# Altium footprint library bitfury.PcbLib: 41 footprints (part 2 of 3)
Each footprint in its own frame and in the unit in brackets; x right, y up, seen from the top. Pads: shape width x height; smd on the part's side, far side on the other; paste and mask are expansions set on the pad; w line width, h text height; cw(c..) or ccw(c..) is an arc to the next point about the centre after c.
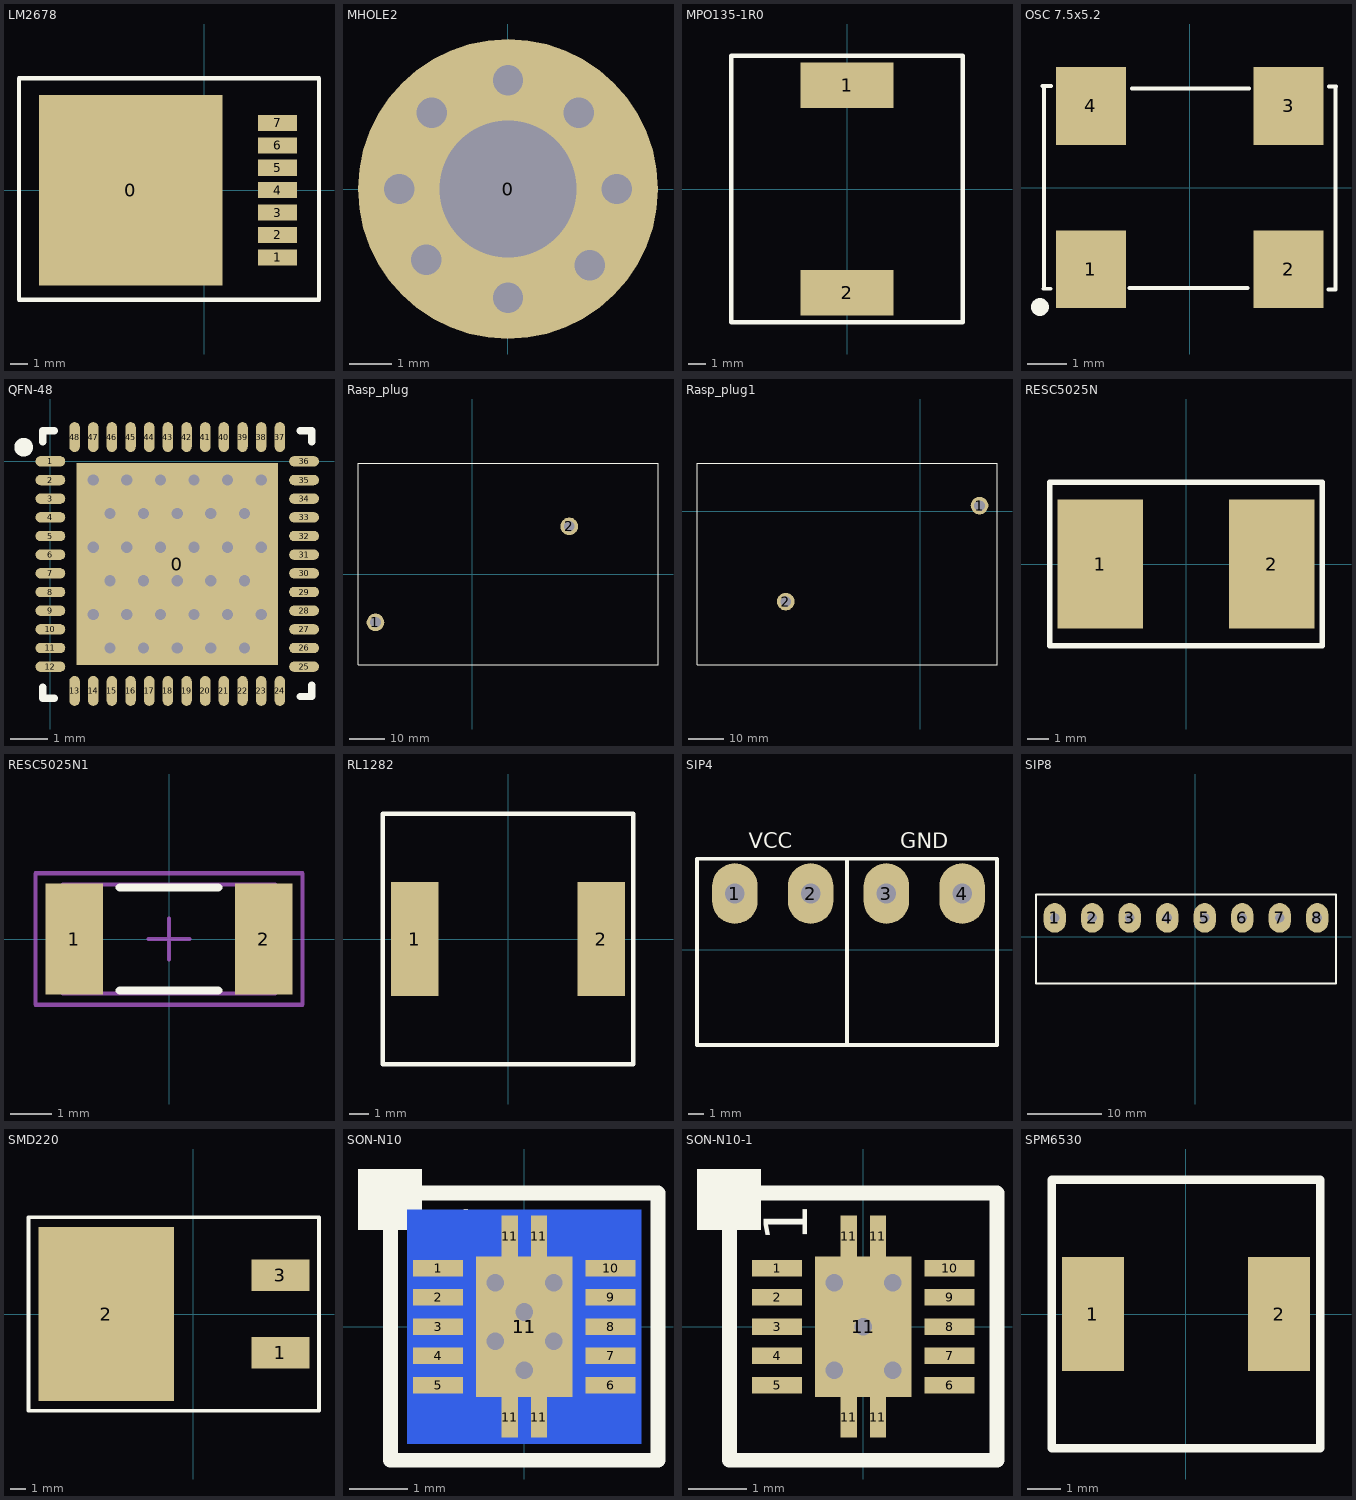
[diagram p1: the footprints below, top view; thin cyan lines are the x and y axes]

## LM2678 [mm]
pads (8):
  rect 10.41x10.8 smd: 0(-4.16,0)
  rect 2.2x0.91 smd: 1(4.16,-3.81) 2(4.16,-2.54) 3(4.16,-1.27) 4(4.16,0) 5(4.16,1.27) 6(4.16,2.54) 7(4.16,3.81)
Top Overlay:
  lines w0.254: -10.51,-6.223 6.508,-6.223 6.508,6.35 -9.875,6.35 -10.51,6.35 -10.51,-6.223

## MHOLE2 [mm]
pads (1):
  round 7 hole 3.2 unplated: 0(0,0)
via 0,2.54 diameter 1.27 hole 0.711
via 2.54,0 diameter 1.27 hole 0.711
via -2.54,0 diameter 1.27 hole 0.711
via 0,-2.54 diameter 1.27 hole 0.711
via -1.905,-1.651 diameter 1.27 hole 0.711
via -1.778,1.778 diameter 1.27 hole 0.711
via 1.651,1.778 diameter 1.27 hole 0.711
via 1.905,-1.778 diameter 1.27 hole 0.711

## MPO135-1R0 [mm]
pads (2):
  rect 5.2x2.54 smd: 1(0,5.83) 2(0,-5.83)
Top Overlay:
  lines w0.254: -6.5,-7.5 6.5,-7.5 6.5,7.5 -6.5,7.5 -6.5,-7.5

## OSC 7.5x5.2 [mm]
pads (4):
  rect 1.8x2 smd: 1(-2.54,-2.1) 2(2.54,-2.1) 3(2.54,2.1) 4(-2.54,2.1)
Top Overlay:
  circle w0.254: c-3.85,-3.07 r0.102
  lines w0.1: -3.78,2.61 -3.56,2.61 ; -3.76,-2.6 -3.58,-2.6 ; -3.75,-2.6 -3.75,2.6 ; -1.55,-2.58 1.49,-2.58 ; -1.48,2.55 1.53,2.55 ; 3.57,-2.62 3.75,-2.62 ; 3.58,2.6 3.76,2.6 ; 3.75,-2.6 3.75,2.6

## QFN-48 [mm]
pads (49):
  rect 5.4x5.4 smd paste-0.7 mask-0.4: 0(3.399,-2.75)
  oval 0.8x0.28 smd paste+0.051 mask+0.075: 1(0,0) 2(0,-0.5) 3(0,-1) 4(0,-1.5) 5(0,-2) 6(0,-2.5) 7(0,-3) 8(0,-3.5) 9(0,-4) 10(0,-4.5) 11(0,-5) 12(0,-5.5) 25(6.798,-5.5) 26(6.798,-5) 27(6.798,-4.5) 28(6.798,-4) 29(6.798,-3.5) 30(6.798,-3) 31(6.798,-2.5) 32(6.798,-2) 33(6.798,-1.5) 34(6.798,-1) 35(6.798,-0.5) 36(6.798,0)
  oval 0.28x0.8 smd paste+0.051 mask+0.075: 13(0.649,-6.149) 14(1.149,-6.149) 15(1.649,-6.149) 16(2.149,-6.149) 17(2.649,-6.149) 18(3.149,-6.149) 19(3.649,-6.149) 20(4.149,-6.149) 21(4.649,-6.149) 22(5.149,-6.149) 23(5.649,-6.149) 24(6.149,-6.149) 37(6.149,0.649) 38(5.649,0.649) 39(5.149,0.649) 40(4.649,0.649) 41(4.149,0.649) 42(3.649,0.649) 43(3.149,0.649) 44(2.649,0.649) 45(2.149,0.649) 46(1.649,0.649) 47(1.149,0.649) 48(0.649,0.649)
via 3.399,-3.2 diameter 0.6 hole 0.3
via 2.499,-3.2 diameter 0.6 hole 0.3
via 1.599,-3.2 diameter 0.6 hole 0.3
via 1.599,-5 diameter 0.6 hole 0.3
via 2.499,-5 diameter 0.6 hole 0.3
via 3.399,-5 diameter 0.6 hole 0.3
via 4.299,-5 diameter 0.6 hole 0.3
via 5.199,-5 diameter 0.6 hole 0.3
via 5.199,-3.2 diameter 0.6 hole 0.3
via 4.299,-3.2 diameter 0.6 hole 0.3
via 3.399,-1.4 diameter 0.6 hole 0.3
via 4.299,-1.4 diameter 0.6 hole 0.3
via 5.199,-1.4 diameter 0.6 hole 0.3
via 2.499,-1.4 diameter 0.6 hole 0.3
via 1.599,-1.4 diameter 0.6 hole 0.3
via 2.949,-2.3 diameter 0.6 hole 0.3
via 3.849,-2.3 diameter 0.6 hole 0.3
via 4.749,-2.3 diameter 0.6 hole 0.3
via 2.049,-2.3 diameter 0.6 hole 0.3
via 1.149,-2.3 diameter 0.6 hole 0.3
via 5.649,-2.3 diameter 0.6 hole 0.3
via 5.649,-4.1 diameter 0.6 hole 0.3
via 4.749,-4.1 diameter 0.6 hole 0.3
via 3.849,-4.1 diameter 0.6 hole 0.3
via 2.949,-4.1 diameter 0.6 hole 0.3
via 2.049,-4.1 diameter 0.6 hole 0.3
via 1.149,-4.1 diameter 0.6 hole 0.3
via 1.149,-0.5 diameter 0.6 hole 0.3
via 2.049,-0.5 diameter 0.6 hole 0.3
via 2.949,-0.5 diameter 0.6 hole 0.3
via 3.849,-0.5 diameter 0.6 hole 0.3
via 4.749,-0.5 diameter 0.6 hole 0.3
via 5.649,-0.5 diameter 0.6 hole 0.3
Top Overlay:
  circle w0.25: c-0.715,0.38 r0.125
  lines w0.2: -0.201,-6.05 -0.201,-6.35 0.099,-6.35 ; -0.201,0.525 -0.201,0.825 0.099,0.825 ; 6.699,-6.3 6.999,-6.3 6.999,-6 ; 6.699,0.825 6.999,0.825 6.999,0.525

## Rasp_plug [mm]
pads (2):
  round 5 hole 3: 1(-27.45,-13.6) 2(27.45,13.6)
Top Overlay:
  lines w0.254: -32.4,-25.55 -32.4,31.45 52.6,31.45 52.6,-25.55 -32.4,-25.55

## Rasp_plug1 [mm]
pads (2):
  round 5 hole 3: 1(16.782,1.662) 2(-38.118,-25.538)
Top Overlay:
  lines w0.254: -63.268,-43.388 21.732,-43.388 21.732,13.612 -63.268,13.612 -63.268,-43.388

## RESC5025N [mm] "Chip Resistor, Body 5.0x2.5mm, IPC Medium Density"
height 0.71
pads (2):
  rect 4x6 smd: 1(-4,0) 2(4,0)
Top Overlay:
  lines w0.254: -6.35,-3.81 6.35,-3.81 6.35,3.81 -6.35,3.81 -6.35,-3.81

## RESC5025N1 [mm] "Chip Resistor, Body 5.0x2.5mm, IPC Medium Density"
height 0.71
pads (2):
  rect 1.4x2.7 smd: 1(-2.3,0) 2(2.3,0)
Top Overlay:
  lines w0.2: -1.2,-1.25 1.2,-1.25 ; -1.2,1.25 1.2,1.25
Mechanical 13:
  lines w0.1: -2.575,-1.325 2.575,-1.325 2.575,1.325 -2.575,1.325 -2.575,-1.325
Mechanical 15:
  lines w0.1: -0.5,0 0.5,0 ; 0,-0.5 0,0.5 ; -3.25,-1.6 3.25,-1.6 3.25,1.6 -3.25,1.6 -3.25,-1.6
3D body: height 0.71, standoff 0, extent -2.575,-1.325 2.575,1.325

## RL1282 [mm]
pads (2):
  rect 2.5x6 smd: 1(-4.9,0) 2(4.9,0)
Top Overlay:
  lines w0.254: -6.6,-6.6 -6.6,6.6 6.6,6.6 6.6,-6.6 -6.6,-6.6

## SIP4 [mm]
pads (4):
  oval 3x4 hole 1.3: 1(-18.7,3.7) 2(-13.7,3.7) 3(-8.7,3.7) 4(-3.7,3.7)
Top Overlay:
  lines w0.254: -11.3,-6.3 -11.3,6 ; -21.2,-6.3 -21.2,6 -1.4,6 -1.4,-6.3 -21.2,-6.3
  text "VCC" at -17.8,6.7 h1
  text "GND" at -7.8,6.7 h1
3D body: height 8, standoff 0.1, extent -21.3,-6.45 -1.3,5.65

## SIP8 [mm]
pads (8):
  oval 3x4 hole 1.3: 1(-19.05,2.54) 2(-13.97,2.54) 3(-8.89,2.54) 4(-3.81,2.54) 5(1.27,2.54) 6(6.35,2.54) 7(11.43,2.54) 8(16.51,2.54)
Top Overlay:
  lines w0.254: -21.59,-6.35 -21.59,5.715 19.05,5.715 19.05,-6.35 -21.59,-6.35

## SMD220 [mm]
pads (3):
  rect 3.81x2.08 smd: 1(5.715,-2.54) 3(5.715,2.54)
  rect 8.89x11.43 smd: 2(-5.715,0)
Top Overlay:
  lines w0.254: -10.795,-6.35 8.255,-6.35 8.255,6.35 -10.795,6.35 -10.795,-6.35

## SON-N10 [mm]
pads (16):
  rect 0.85x0.28 smd paste+0.07 mask+0.07: 1(-1.475,1) 2(-1.475,0.5) 3(-1.475,0) 4(-1.475,-0.5) 5(-1.475,-1) 6(1.475,-1) 7(1.475,-0.5) 8(1.475,0) 9(1.475,0.5) 10(1.475,1)
  rect 0.28x0.7 smd paste+0 mask+0: 11(-0.25,-1.549) 11(-0.25,1.549) 11(0.25,-1.549) 11(0.25,1.549)
  rect 4x4 smd far side: 11(0,0)
  rect 1.65x2.4 smd: 11(0,0)
via 0,0.25 diameter 0.6 hole 0.3
via -0.5,-0.25 diameter 0.6 hole 0.3
via 0.5,-0.25 diameter 0.6 hole 0.3
via 0,-0.75 diameter 0.6 hole 0.3
via -0.5,0.75 diameter 0.6 hole 0.3
via 0.5,0.75 diameter 0.6 hole 0.3
Top Overlay:
  rectangle: -2.845,1.651 -1.753,2.692
  lines w0.254: -2.286,1.778 -2.286,-2.286 2.286,-2.286 2.286,2.286 -1.778,2.286
  text "1" at -0.711,1.448 h1.27
3D body: height 0.8, standoff 0, extent -1.97,-1.899 1.97,1.899

## SON-N10-1 [mm]
pads (15):
  rect 0.85x0.28 smd paste+0.07 mask+0.07: 1(-1.475,1) 2(-1.475,0.5) 3(-1.475,0) 4(-1.475,-0.5) 5(-1.475,-1) 6(1.475,-1) 7(1.475,-0.5) 8(1.475,0) 9(1.475,0.5) 10(1.475,1)
  rect 0.28x0.7 smd paste+0 mask+0: 11(-0.25,-1.549) 11(-0.25,1.549) 11(0.25,-1.549) 11(0.25,1.549)
  rect 1.65x2.4 smd paste+0 mask+0: 11(0,0)
via 0,0 diameter 0.6 hole 0.3
via -0.5,-0.75 diameter 0.6 hole 0.3
via 0.5,-0.75 diameter 0.6 hole 0.3
via -0.5,0.75 diameter 0.6 hole 0.3
via 0.5,0.75 diameter 0.6 hole 0.3
Top Overlay:
  rectangle: -2.845,1.651 -1.753,2.692
  lines w0.254: -2.286,1.778 -2.286,-2.286 2.286,-2.286 2.286,2.286 -1.778,2.286
  text "1" at -0.711,1.448 h1.27
3D body: height 0.8, standoff 0, extent -1.97,-1.899 1.97,1.899

## SPM6530 [mm]
pads (2):
  rect 1.85x3.4 smd: 1(-2.775,0) 2(2.775,0)
Top Overlay:
  lines w0.254: -4,3.556 -4,4 0,4 3.81,4 4,4 4,2.54 4,-2.54 4,-4 -4,-4 -4,-2.286 -4,3.81 ; 0,-4 3.81,-4